# Altium footprint library PcbLib1.PcbLib: 102 footprints (part 3 of 7)
Each footprint in its own frame and in the unit in brackets; x right, y up, seen from the top. Pads: shape width x height; smd on the part's side, far side on the other; paste and mask are expansions set on the pad; w line width, h text height; cw(c..) or ccw(c..) is an arc to the next point about the centre after c.
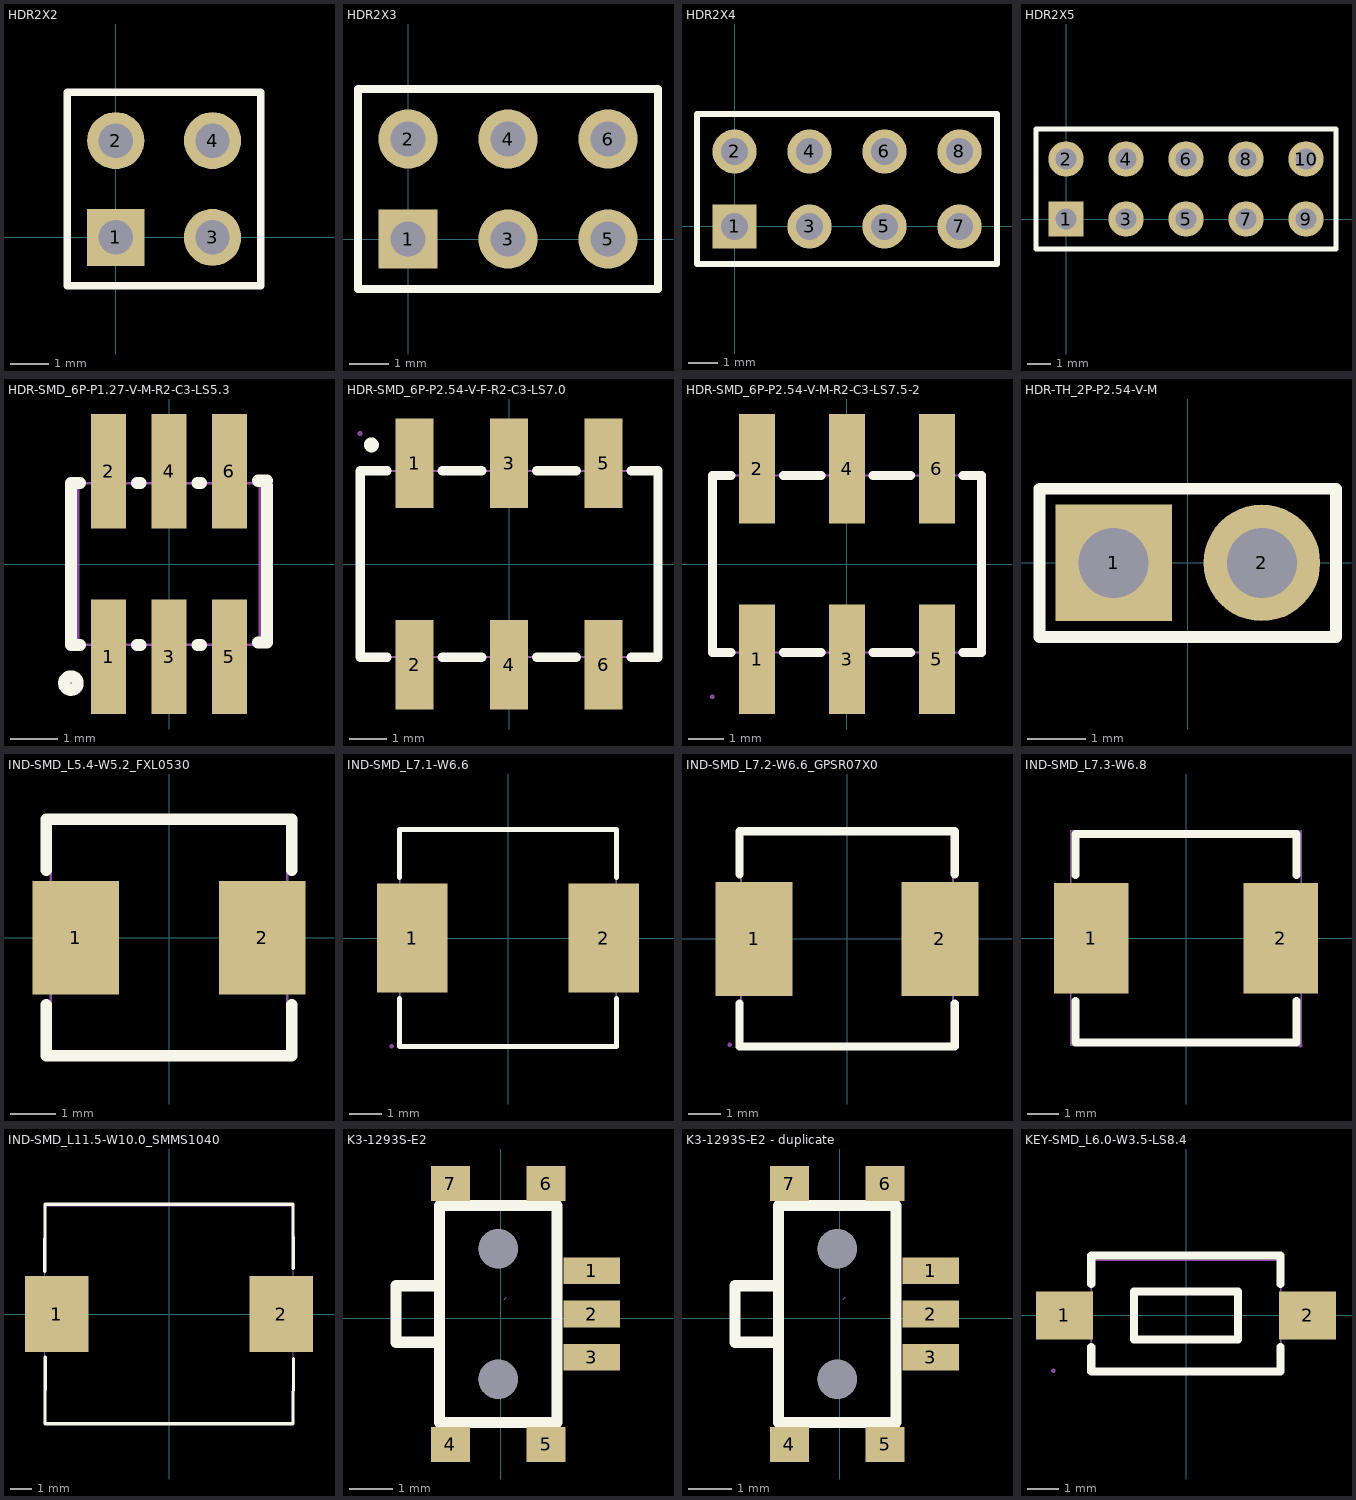
[diagram p2: the footprints below, top view; thin cyan lines are the x and y axes]

## HDR2X2 [mm] "Connector; Header; 2x2 Position"
pads (4):
  rect 1.5x1.5 hole 0.9: 1(0,0)
  round 1.5 hole 0.9: 2(0,2.54) 3(2.54,0) 4(2.54,2.54)
Top Overlay:
  lines w0.2: -1.27,-1.27 -1.27,3.81 3.81,3.81 3.81,-1.27 -1.27,-1.27

## HDR2X3 [mm] "Connector; Header; 3x2 Position"
pads (6):
  rect 1.5x1.5 hole 0.9: 1(0,0)
  round 1.5 hole 0.9: 2(0,2.54) 3(2.54,0) 4(2.54,2.54) 5(5.08,0) 6(5.08,2.54)
Top Overlay:
  lines w0.2: 1.482,-1.27 6.35,-1.27 ; 6.35,-1.27 6.35,3.81 -1.27,3.81 -1.27,-1.27 6.35,-1.27

## HDR2X4 [mm] "Connector; Header; 4x2 Position"
pads (8):
  rect 1.5x1.5 hole 0.9: 1(0,0)
  round 1.5 hole 0.9: 2(0,2.54) 3(2.54,0) 4(2.54,2.54) 5(5.08,0) 6(5.08,2.54) 7(7.62,0) 8(7.62,2.54)
Top Overlay:
  lines w0.2: -1.27,-1.27 8.89,-1.27 8.89,3.81 -1.27,3.81 -1.27,-1.27

## HDR2X5 [mm] "Connector; Header; 5x2 Position"
pads (10):
  rect 1.5x1.5 hole 0.9: 1(0,0)
  round 1.5 hole 0.9: 2(0,2.54) 3(2.54,0) 4(2.54,2.54) 5(5.08,0) 6(5.08,2.54) 7(7.62,0) 8(7.62,2.54) 9(10.16,0) 10(10.16,2.54)
Top Overlay:
  lines w0.2: -1.27,-1.27 11.43,-1.27 11.43,3.81 -1.27,3.81 -1.27,-1.27

## HDR-SMD_6P-P1.27-V-M-R2-C3-LS5.3 [mm]
pads (6):
  rect 0.74x2.4 smd paste+0 mask+0.05: 1(-1.27,-1.95) 2(-1.27,1.95) 3(0,-1.95) 4(0,1.95) 5(1.27,-1.95) 6(1.27,1.95)
Top Overlay:
  circle w0.254: c-2.06,-2.5 r0.141
  lines w0.254: -1.871,-1.7 -2.06,-1.7 -2.06,1.7 -1.871,1.7 ; -0.669,-1.7 -0.601,-1.7 ; -0.669,1.7 -0.601,1.7 ; 0.601,-1.7 0.669,-1.7 ; 0.601,1.7 0.669,1.7 ; 1.871,-1.651 2.06,-1.651 2.06,1.651 ; 1.871,1.749 2.06,1.749
Mechanical 15:
  region: -0.2,-1.25 0.2,-1.25 0.2,-2.65 -0.2,-2.65
  region: -1.47,-1.25 -1.07,-1.25 -1.07,-2.65 -1.47,-2.65
  region: 1.07,-1.25 1.47,-1.25 1.47,-2.65 1.07,-2.65
  region: 1.07,2.65 1.47,2.65 1.47,1.25 1.07,1.25
  region: -0.2,2.65 0.2,2.65 0.2,1.25 -0.2,1.25
  region: -1.47,2.65 -1.07,2.65 -1.07,1.25 -1.47,1.25
  region: -1.845,-2.65 -1.845,-2.625 -1.88,-2.59 -1.93,-2.59 -1.965,-2.625 -1.965,-2.65 -1.965,-2.675 -1.93,-2.71 -1.88,-2.71 -1.845,-2.675 -1.845,-2.65
  lines w0.051: -1.905,-1.7 1.905,-1.7 1.905,1.7 -1.905,1.7 -1.905,-1.7

## HDR-SMD_6P-P2.54-V-F-R2-C3-LS7.0 [mm]
pads (6):
  rect 1.02x2.4 smd paste+0 mask+0.05: 1(-2.54,2.704) 2(-2.54,-2.704) 3(0,2.704) 4(0,-2.704) 5(2.54,2.704) 6(2.54,-2.704)
Top Overlay:
  circle w0.2: c-3.7,3.2 r0.1
  lines w0.254: -3.5,2.5 -3.281,2.5 ; -3.3,2.5 -4,2.5 -4,-2.5 -3.281,-2.5 ; -1.799,-2.5 -0.741,-2.5 ; -1.799,2.5 -0.741,2.5 ; 0.741,-2.5 1.799,-2.5 ; 0.741,2.5 1.799,2.5 ; 3.281,-2.5 4,-2.5 4,2.5 3.281,2.5
Mechanical 15:
  region: 2.24,-1.904 2.84,-1.904 2.84,-3.504 2.24,-3.504
  region: -0.3,-1.904 0.3,-1.904 0.3,-3.504 -0.3,-3.504
  region: -2.84,-1.904 -2.24,-1.904 -2.24,-3.504 -2.84,-3.504
  region: -2.84,3.504 -2.24,3.504 -2.24,1.904 -2.84,1.904
  region: -0.3,3.504 0.3,3.504 0.3,1.904 -0.3,1.904
  region: 2.24,3.504 2.84,3.504 2.84,1.904 2.24,1.904
  region: -3.94,3.504 -3.94,3.529 -3.975,3.564 -4.025,3.564 -4.06,3.529 -4.06,3.504 -4.06,3.479 -4.025,3.444 -3.975,3.444 -3.94,3.479 -3.94,3.504
  lines w0.051: -4,-2.5 4,-2.5 4,2.5 -4,2.5 -4,-2.5

## HDR-SMD_6P-P2.54-V-M-R2-C3-LS7.5-2 [mm]
pads (6):
  rect 1.02x3.1 smd paste+0 mask+0.05: 1(-2.54,-2.69) 2(-2.54,2.69) 3(0,-2.69) 4(0,2.69) 5(2.54,-2.69) 6(2.54,2.69)
Top Overlay:
  lines w0.254: -3.281,-2.5 -3.8,-2.5 -3.8,2.5 -3.281,2.5 ; -1.799,-2.5 -0.741,-2.5 ; -1.799,2.5 -0.741,2.5 ; 0.741,-2.5 1.799,-2.5 ; 0.741,2.5 1.799,2.5 ; 3.281,-2.5 3.8,-2.5 3.8,2.5 3.281,2.5
Mechanical 15:
  region: -3.75,-3.75 -3.75,-3.725 -3.785,-3.69 -3.835,-3.69 -3.87,-3.725 -3.87,-3.75 -3.87,-3.775 -3.835,-3.81 -3.785,-3.81 -3.75,-3.775 -3.75,-3.75
  region: -2.86,-1.75 -2.22,-1.75 -2.22,-3.75 -2.86,-3.75
  region: -0.32,-1.75 0.32,-1.75 0.32,-3.75 -0.32,-3.75
  region: 2.22,-1.75 2.86,-1.75 2.86,-3.75 2.22,-3.75
  region: -2.86,3.75 -2.22,3.75 -2.22,1.75 -2.86,1.75
  region: -0.32,3.75 0.32,3.75 0.32,1.75 -0.32,1.75
  region: 2.22,3.75 2.86,3.75 2.86,1.75 2.22,1.75
  lines w0.051: -3.81,-2.5 -3.81,2.5 3.81,2.5 3.81,-2.5 -3.81,-2.5
3D body "SMD,P=2.54mm214.STEP": height 9.19, standoff -0.01, extent -3.81,-3.75 3.82,3.75

## HDR-TH_2P-P2.54-V-M [mm]
pads (2):
  rect 2x2 hole 1.2: 1(-1.27,0)
  round 2 hole 1.2: 2(1.27,0)
Top Overlay:
  lines w0.203: -2.54,-1.27 2.54,-1.27 2.54,1.27 -0.635,1.27 -2.54,1.27 -2.54,-1.27
Mechanical 15:
  region: -2.48,-1.25 -2.48,-1.225 -2.515,-1.19 -2.565,-1.19 -2.6,-1.225 -2.6,-1.25 -2.6,-1.275 -2.565,-1.31 -2.515,-1.31 -2.48,-1.275
  region: 0.95,0.32 1.59,0.32 1.59,-0.32 0.95,-0.32
  region: -1.59,0.32 -0.95,0.32 -0.95,-0.32 -1.59,-0.32
  lines w0.051: -2.54,-1.25 -2.54,1.25 2.54,1.25 2.54,-1.25 -2.54,-1.25
3D body "插件,P=2.54mm.STEP": height 8.5, standoff -3, extent -2.54,-1.27 2.55,1.27

## IND-SMD_L5.4-W5.2_FXL0530 [mm]
pads (2):
  rect 1.9x2.5 smd: 1(-2.05,0) 2(2.05,0)
Top Overlay:
  lines w0.254: -2.7,-1.481 -2.7,-2.6 2.7,-2.6 2.7,-1.481 ; -2.7,1.481 -2.7,2.6 2.7,2.6 2.7,1.481
Mechanical 15:
  region: -2.64,-2.6 -2.64,-2.575 -2.675,-2.54 -2.725,-2.54 -2.76,-2.575 -2.76,-2.6 -2.76,-2.625 -2.725,-2.66 -2.675,-2.66 -2.64,-2.625 -2.64,-2.6
  region: -2.7,1.1 -1.5,1.1 -1.5,-1.1 -2.7,-1.1
  region: 2.7,-1.1 1.5,-1.1 1.5,1.1 2.7,1.1
  lines w0.051: -2.6,-2.6 2.6,-2.6 2.6,2.6 -2.6,2.6 -2.6,-2.6
3D body "SMD,5.4x5.2x2.8mm214.STEP": height 2.8, standoff -0.01, extent -2.7,-2.6 2.7,2.6

## IND-SMD_L7.1-W6.6 [mm]
pads (2):
  rect 2.15x3.32 smd: 1(-2.913,0) 2(2.913,0)
Top Overlay:
  lines w0.152: -3.302,-1.84 -3.302,-3.302 3.302,-3.302 3.302,-1.84 ; -3.302,1.84 -3.302,3.302 3.302,3.302 3.302,1.84
Mechanical 15:
  region: -3.49,-3.3 -3.49,-3.275 -3.525,-3.24 -3.575,-3.24 -3.61,-3.275 -3.61,-3.3 -3.61,-3.325 -3.575,-3.36 -3.525,-3.36 -3.49,-3.325 -3.49,-3.3
  region: -3.55,1.5 -1.95,1.5 -1.95,-1.5 -3.55,-1.5
  region: 1.95,1.5 3.55,1.5 3.55,-1.5 1.95,-1.5
  lines w0.051: -3.3,-3.3 3.3,-3.3 3.3,3.3 -3.3,3.3 -3.3,-3.3
3D body "SMD,6.6x7.1mm214.STEP": height 3.1, standoff 0, extent -3.456,-3.298 3.544,3.402

## IND-SMD_L7.2-W6.6_GPSR07X0 [mm] "10uh电感"
pads (2):
  rect 2.35x3.5 smd: 1(-2.85,0) 2(2.85,0)
Top Overlay:
  lines w0.254: -3.3,-1.981 -3.3,-3.3 3.3,-3.3 3.3,-1.981 ; -3.3,1.981 -3.3,3.3 3.3,3.3 3.3,1.981
Mechanical 15:
  region: -3.54,-3.25 -3.54,-3.225 -3.575,-3.19 -3.625,-3.19 -3.66,-3.225 -3.66,-3.25 -3.66,-3.275 -3.625,-3.31 -3.575,-3.31 -3.54,-3.275
  region: 1.9,1.5 3.6,1.5 3.6,-1.5 1.9,-1.5
  region: -1.9,-1.5 -3.6,-1.5 -3.6,1.5 -1.9,1.5
  lines w0.051: -3.25,-3.25 3.25,-3.25 3.25,3.25 -3.25,3.25 -3.25,-3.25
3D body "0630.STEP": height 2.9, standoff 0, extent -3.55,-3.3 3.55,3.3

## IND-SMD_L7.3-W6.8 [mm] "功率电感"
pads (2):
  rect 2.35x3.5 smd: 1(-3,0) 2(3,0)
Top Overlay:
  lines w0.254: -3.5,-2 -3.5,-3.3 3.5,-3.3 3.5,-2 ; -3.5,2 -3.5,3.3 3.5,3.3 3.5,2
Mechanical 15:
  region: -3.65,1.45 -2.05,1.45 -2.05,-1.45 -3.65,-1.45
  region: 2.05,1.45 3.65,1.45 3.65,-1.45 2.05,-1.45
  region: 3.68,-3.4 3.68,-3.375 3.645,-3.34 3.595,-3.34 3.56,-3.375 3.56,-3.4 3.56,-3.425 3.595,-3.46 3.645,-3.46 3.68,-3.425
  lines w0.051: -3.65,-3.4 3.65,-3.4 3.65,3.4 -3.65,3.4 -3.65,-3.4

## IND-SMD_L11.5-W10.0_SMMS1040 [mm]
pads (2):
  rect 2.924x3.5 smd: 1(-5.18,0) 2(5.18,0)
Top Overlay:
  lines w0.152: -5.74,1.981 -5.726,5.076 5.726,5.076 5.736,2.102 ; -5.713,-1.993 -5.726,-5.076 5.726,-5.076 5.754,-2.055
Mechanical 15:
  region: -5.69,-5 -5.69,-4.975 -5.725,-4.94 -5.775,-4.94 -5.81,-4.975 -5.81,-5 -5.81,-5.025 -5.775,-5.06 -5.725,-5.06 -5.69,-5.025 -5.69,-5
  region: -3.75,-1.5 -5.75,-1.5 -5.75,1.5 -3.75,1.5
  region: 5.75,-1.5 3.75,-1.5 3.75,1.5 5.75,1.5
  lines w0.051: -5.75,-5 -5.75,5 5.75,5 5.75,-5 -5.75,-5
3D body "-214.STEP": height 4.1, standoff -0.03, extent -5.75,-5.25 5.75,5.25

## K3-1293S-E2 [mil]
pads (9):
  rect 51.18x24 smd mask+2: 1(82.17,43.23) 2(82.17,3.86) 3(82.17,-35.51)
  rect 35.43x31.49 smd: 4(-45.81,-114.25) 5(40.8,-114.25) 6(40.8,121.97) 7(-45.81,121.97)
  round 35.43 hole 35.43 unplated: ""(-2.5,-55.24) ""(-2.5,62.96)
Top Overlay:
  lines w10: -55.7,-21.74 -95,-21.74 -95,29.46 -55.7,29.46 ; -55.7,102.26 50.6,102.26 ; -55.65,-94.57 -55.65,102.28 ; -55.6,-94.54 50.7,-94.54 ; 50.65,-94.57 50.65,102.28
Mechanical 15:
  lines w0.1: 2.88,17.18 4.88,19.18
3D body "User Library-Switch_mini_5x3mm_SPDT_Side_SMT.STEP": height 55.12, standoff -19.68, extent -114.72,-113.11 90,123.11

## K3-1293S-E2 - duplicate [mil]
pads (9):
  rect 51.18x24 smd mask+2: 1(82.17,43.23) 2(82.17,3.86) 3(82.17,-35.51)
  rect 35.43x31.49 smd: 4(-45.81,-114.25) 5(40.8,-114.25) 6(40.8,121.97) 7(-45.81,121.97)
  round 35.43 hole 35.43 unplated: ""(-2.5,-55.24) ""(-2.5,62.96)
Top Overlay:
  lines w10: -55.7,-21.74 -95,-21.74 -95,29.46 -55.7,29.46 ; -55.7,102.26 50.6,102.26 ; -55.65,-94.57 -55.65,102.28 ; -55.6,-94.54 50.7,-94.54 ; 50.65,-94.57 50.65,102.28
Mechanical 15:
  lines w0.1: 2.88,17.18 4.88,19.18
3D body "User Library-Switch_mini_5x3mm_SPDT_Side_SMT.STEP": height 55.12, standoff -19.68, extent -114.72,-113.11 90,123.11

## KEY-SMD_L6.0-W3.5-LS8.4 [mm]
pads (2):
  rect 1.8x1.524 smd: 1(-3.85,0) 2(3.85,0)
Top Overlay:
  lines w0.254: -3,-0.993 -3,-1.778 2.921,-1.778 ; -3,0.993 -3,1.905 3,1.905 3,0.993 ; 3,-1.778 3,-0.993 ; -1.651,-0.762 -1.651,0.762 1.651,0.762 1.651,-0.762 -1.651,-0.762
Mechanical 15:
  region: 3.5,-0.5 3.5,0.5 4.2,0.5 4.2,-0.5
  region: 2.99,-0.5 2.99,0.5 3.51,0.5 3.51,-0.5
  region: -4.2,-0.5 -4.2,0.5 -3.5,0.5 -3.5,-0.5
  region: -3.51,-0.5 -3.51,0.5 -2.99,0.5 -2.99,-0.5
  region: -4.14,-1.75 -4.14,-1.725 -4.175,-1.69 -4.225,-1.69 -4.26,-1.725 -4.26,-1.75 -4.26,-1.775 -4.225,-1.81 -4.175,-1.81 -4.14,-1.775 -4.14,-1.75
  lines w0.051: -3,-1.75 -3,1.75 3,1.75 3,-1.75 -3,-1.75
3D body "SMD214.STEP": height 2.6, standoff 0, extent -3.95,-1.8 3.95,1.801